# Altium footprint library myPcbLib.PcbLib: 987 footprints (part 42 of 62)
Each footprint in its own frame and in the unit in brackets; x right, y up, seen from the top. Pads: shape width x height; smd on the part's side, far side on the other; paste and mask are expansions set on the pad; w line width, h text height; cw(c..) or ccw(c..) is an arc to the next point about the centre after c.
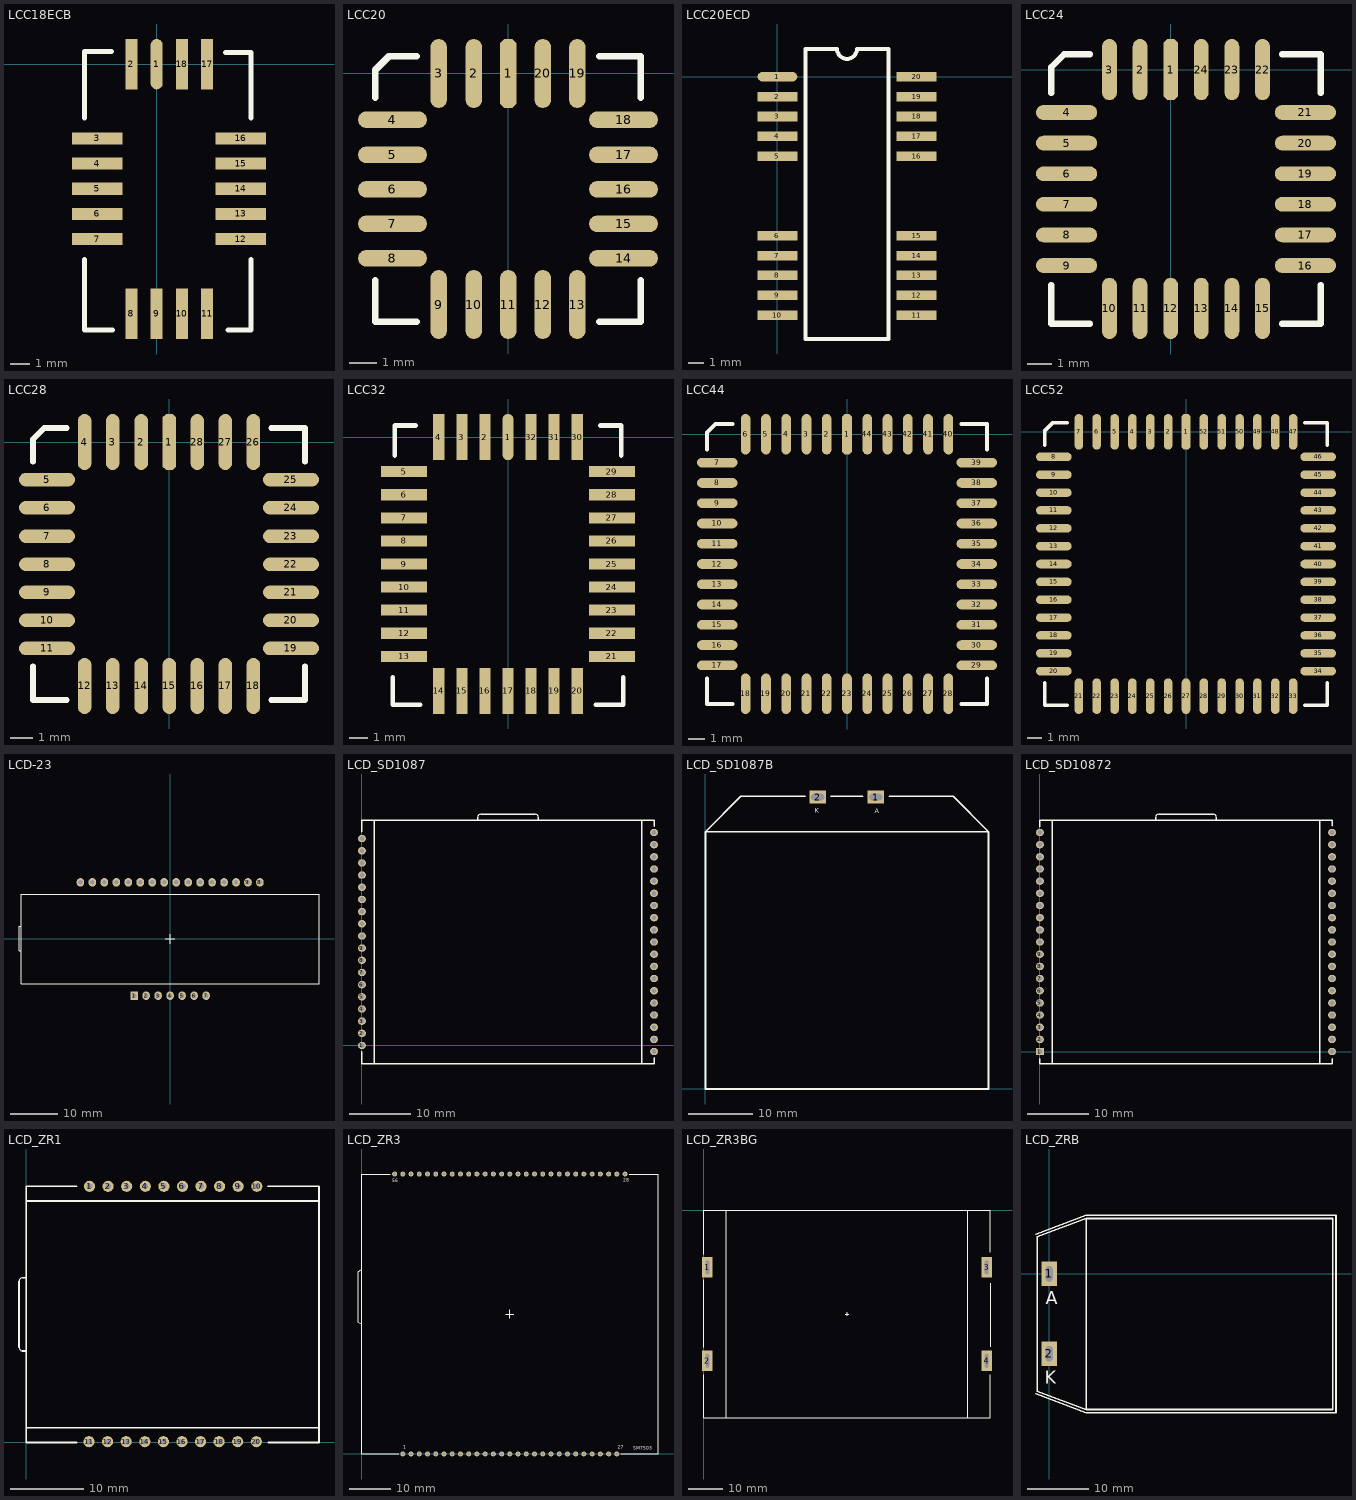
[diagram p41: the footprints below, top view; thin cyan lines are the x and y axes]

## LCC18ECB [mil]
pads (18):
  oval 24x100 smd: 1(0,0)
  rect 24x100 smd: 2(-50,0) 8(-50,-495) 9(0,-495) 10(50,-495) 11(100,-495) 17(100,0) 18(50,0)
  rect 100x24 smd: 3(-118,-147) 4(-118,-197) 5(-118,-247) 6(-118,-297) 7(-118,-347) 12(167,-347) 13(167,-297) 14(167,-247) 15(167,-197) 16(167,-147)
Top Overlay:
  lines w10: -143,-387 -143,-527 -88,-527 ; -143,-107 -143,25 -90,25 ; 137,23 187,23 187,-107 ; 142,-527 187,-527 187,-387

## LCC20 [mil]
pads (20):
  oct 24x100 smd: 1(0,0)
  oval 24x100 smd: 2(-50,0) 3(-101,0) 9(-101,-335) 10(-50,-335) 11(0,-335) 12(50,-335) 13(100,-335) 19(100,0) 20(50,0)
  oval 100x24 smd: 4(-168,-67) 5(-168,-118) 6(-168,-168) 7(-168,-218) 8(-168,-268) 14(167,-268) 15(167,-218) 16(167,-168) 17(167,-118) 18(167,-67)
Top Overlay:
  lines w10: -193,-300 -193,-360 -133,-360 ; -193,-35 -193,5 -173,25 -133,25 ; 132,-360 192,-360 192,-300 ; 132,25 192,25 192,-35

## LCC20ECD [mil]
pads (20):
  oval 100x24 smd: 1(0,0)
  rect 100x24 smd: 2(0,-50) 3(0,-100) 4(0,-150) 5(0,-200) 6(0,-400) 7(0,-450) 8(0,-500) 9(0,-550) 10(0,-600) 11(350,-600) 12(350,-550) 13(350,-500) 14(350,-450) 15(350,-400) 16(350,-200) 17(350,-150) 18(350,-100) 19(350,-50) 20(350,0)
Top Overlay:
  lines w10: 70,-660 280,-660 280,70 200,70 cw(c175,70) 150,70 70,70 70,-660

## LCC24 [mil]
pads (24):
  oct 24x100 smd: 1(0,0)
  oval 24x100 smd: 2(-50,0) 3(-100,0) 10(-100,-390) 11(-50,-390) 12(0,-390) 13(50,-390) 14(100,-390) 15(150,-390) 22(150,0) 23(100,0) 24(50,0)
  oval 100x24 smd: 4(-170,-70) 5(-170,-120) 6(-170,-170) 7(-170,-220) 8(-170,-270) 9(-170,-320) 16(220,-320) 17(220,-270) 18(220,-220) 19(220,-170) 20(220,-120) 21(220,-70)
Top Overlay:
  lines w10: -195,-352 -195,-415 -132,-415 ; -195,-38 -195,4 -174,25 -132,25 ; 182,-415 245,-415 245,-352 ; 182,25 245,25 245,-38

## LCC28 [mil]
pads (28):
  oct 24x100 smd: 1(0,0)
  oval 24x100 smd: 2(-50,0) 3(-101,0) 4(-151,0) 12(-151,-435) 13(-101,-435) 14(-50,-435) 15(0,-435) 16(50,-435) 17(100,-435) 18(150,-435) 26(150,0) 27(100,0) 28(50,0)
  oval 100x24 smd: 5(-218,-67) 6(-218,-117) 7(-218,-168) 8(-218,-218) 9(-218,-268) 10(-218,-318) 11(-218,-368) 19(217,-368) 20(217,-318) 21(217,-268) 22(217,-218) 23(217,-168) 24(217,-117) 25(217,-67)
Top Overlay:
  lines w10: -243,-400 -243,-460 -183,-460 ; -243,-35 -243,5 -223,25 -183,25 ; 182,-460 242,-460 242,-400 ; 182,25 242,25 242,-35

## LCC32 [mil]
pads (32):
  oval 24x100 smd: 1(0,0)
  rect 24x100 smd: 2(-50,0) 3(-100,0) 4(-150,0) 14(-150,-550) 15(-100,-550) 16(-50,-550) 17(0,-550) 18(50,-550) 19(100,-550) 20(150,-550) 30(150,0) 31(100,0) 32(50,0)
  rect 100x24 smd: 5(-225,-75) 6(-225,-125) 7(-225,-175) 8(-225,-225) 9(-225,-275) 10(-225,-325) 11(-225,-375) 12(-225,-425) 13(-225,-475) 21(225,-475) 22(225,-425) 23(225,-375) 24(225,-325) 25(225,-275) 26(225,-225) 27(225,-175) 28(225,-125) 29(225,-75)
Top Overlay:
  lines w10: -250,-520 -250,-580 -190,-580 ; -245,-40 -245,25 -200,25 ; 190,-580 250,-580 250,-520 ; 200,25 245,25 245,-40

## LCC44 [mil]
pads (44):
  oct 24x100 smd: 1(0,0)
  oval 24x100 smd: 2(-50,0) 3(-100,0) 4(-150,0) 5(-200,0) 6(-250,0) 18(-250,-640) 19(-200,-640) 20(-150,-640) 21(-100,-640) 22(-50,-640) 23(0,-640) 24(50,-640) 25(100,-640) 26(150,-640) 27(200,-640) 28(250,-640) 40(250,0) 41(200,0) 42(150,0) 43(100,0) 44(50,0)
  oval 100x24 smd: 7(-320,-70) 8(-320,-120) 9(-320,-170) 10(-320,-220) 11(-320,-270) 12(-320,-320) 13(-320,-370) 14(-320,-420) 15(-320,-470) 16(-320,-520) 17(-320,-570) 29(320,-570) 30(320,-520) 31(320,-470) 32(320,-420) 33(320,-370) 34(320,-320) 35(320,-270) 36(320,-220) 37(320,-170) 38(320,-120) 39(320,-70)
Top Overlay:
  lines w10: -345,-602 -345,-665 -282,-665 ; -345,-38 -345,4 -324,25 -282,25 ; 282,-665 345,-665 345,-602 ; 282,25 345,25 345,-38

## LCC52 [mil]
pads (52):
  oct 24x100 smd: 1(0,0)
  oval 24x100 smd: 2(-50,0) 3(-100,0) 4(-150,0) 5(-200,0) 6(-250,0) 7(-300,0) 21(-300,-740) 22(-250,-740) 23(-200,-740) 24(-150,-740) 25(-100,-740) 26(-50,-740) 27(0,-740) 28(50,-740) 29(100,-740) 30(150,-740) 31(200,-740) 32(250,-740) 33(300,-740) 47(300,0) 48(250,0) 49(200,0) 50(150,0) 51(100,0) 52(50,0)
  oval 100x24 smd: 8(-370,-70) 9(-370,-120) 10(-370,-170) 11(-370,-220) 12(-370,-270) 13(-370,-320) 14(-370,-370) 15(-370,-420) 16(-370,-470) 17(-370,-520) 18(-370,-570) 19(-370,-620) 20(-370,-670) 34(370,-670) 35(370,-620) 36(370,-570) 37(370,-520) 38(370,-470) 39(370,-420) 40(370,-370) 41(370,-320) 42(370,-270) 43(370,-220) 44(370,-170) 45(370,-120) 46(370,-70)
Top Overlay:
  lines w10: -395,-702 -395,-765 -332,-765 ; -395,-38 -395,4 -374,25 -332,25 ; 332,-765 395,-765 395,-702 ; 332,25 395,25 395,-38

## LCD-23 [mm] "GDH784WP"
height 6
pads (23):
  rect 1.6x1.8 hole 0.94: 1(-7.64,-12.003)
  oval 1.6x1.8 hole 0.94: 2(-5.1,-12.003) 3(-2.56,-12.003) 4(-0.02,-12.003) 5(2.52,-12.003) 6(5.06,-12.003) 7(7.6,-12.003) 8(19,12) 9(16.467,12) 10(13.933,12)
  oval 1.6x1.8 hole 0.99: 11(11.4,12) 12(8.867,12) 13(6.333,12) 14(3.8,12) 15(1.267,12) 16(-1.267,12) 17(-3.8,12) 18(-6.333,12) 19(-8.867,12) 20(-11.4,12) 21(-13.933,12) 22(-16.467,12) 23(-19,12)
Top Overlay:
  lines w0.254: -1,0 1,0 0,0 ; 0,-1 0,1 ; -32,-2.5 -31.5,-2.5 -31.5,2.75 -32,2.75 -32,-2.5 ; -31.5,-9.5 31.5,-9.5 31.5,9.5 -31.5,9.5 -31.5,-9.5

## LCD_SD1087 [mm]
height 2.7
pads (37):
  oval 1.3x1.2 hole 0.8: 1(0,0) 2(0,2) 3(0,4) 4(0,6) 5(0,8) 6(0,10) 7(0,12) 8(0,14) 9(0,16) 10(0,18) 11(0,20) 12(0,22) 13(0,24) 14(0,26) 15(0,28) 16(0,30) 17(0,32) 18(0,34) 19(48,-1) 20(48,1) 21(48,3) 22(48,5) 23(48,7) 24(48,9) 25(48,11) 26(48,13) 27(48,15) 28(48,17) 29(48,19) 30(48,21) 31(48,23) 32(48,25) 33(48,27) 34(48,29) 35(48,31) 36(48,33) 37(48,35)
Top Overlay:
  lines w0.127: 19,37.499 cw(c19.5,37.499) 19.5,37.999 ; 28.5,37.999 cw(c28.5,37.499) 29,37.499
  lines w0.254: 0,-1.05 0,-3.001 48,-3.001 48,-2.025 ; 0,35.15 0,36.999 48,36.999 48,36.05 ; 2,-3.001 2,36.999 ; 19,36.999 19,37.499 ; 19.5,37.999 28.5,37.999 ; 29,36.999 29,37.499 ; 46,-3.001 46,36.999

## LCD_SD1087B [mm]
pads (2):
  rect 2.5x2 hole 1 slot 2 at 0 deg: 1(26.474,45.373) 2(17.457,45.373)
Top Overlay:
  lines w0.254: 0,1.2 0,0 ; 15.527,45.5 5.5,45.5 0,40 ; 19.489,45.491 24.417,45.491 ; 28.608,45.5 38.5,45.5 44,40 ; 44,1.2 44,0 ; 0,0 0,40 ; 0,0 44,0 ; 0,40 44,40 ; 44,0 44,40
  text "K" at 17,42.951 h0.75
  text "A" at 26.347,42.824 h0.75

## LCD_SD10872 [mm]
height 2.7
pads (38):
  rect 1.3x1.2 hole 0.8: 1(0,0)
  oval 1.3x1.2 hole 0.8: 2(0,2) 3(0,4) 4(0,6) 5(0,8) 6(0,10) 7(0,12) 8(0,14) 9(0,16) 10(0,18) 11(0,20) 12(0,22) 13(0,24) 14(0,26) 15(0,28) 16(0,30) 17(0,32) 18(0,34) 19(0,36) 20(48,0) 21(48,2) 22(48,4) 23(48,6) 24(48,8) 25(48,10) 26(48,12) 27(48,14) 28(48,16) 29(48,18) 30(48,20) 31(48,22) 32(48,24) 33(48,26) 34(48,28) 35(48,30) 36(48,32) 37(48,34) 38(48,36)
Top Overlay:
  lines w0.127: 19,38.498 cw(c19.5,38.498) 19.5,38.998 ; 28.5,38.998 cw(c28.5,38.498) 29,38.498
  lines w0.254: 0,-1.2 0,-2.002 48,-2.002 48,-1.15 ; 2,-2.002 2,37.998 ; 19,37.998 19,38.498 ; 19.5,38.998 28.5,38.998 ; 29,37.998 29,38.498 ; 46,-2.002 46,37.998 ; 48,37.075 48,37.998 0,37.998 ; 0,37.998 0,36.925 0,37.998

## LCD_ZR1 [mil]
pads (20):
  round 60 hole 30: 1(340.08,1377.95) 2(440.16,1377.95) 3(540.16,1377.95) 4(640.16,1377.95) 5(740.16,1377.95) 6(840.16,1377.95) 7(940.16,1377.95) 8(1040.16,1377.95) 9(1140.16,1377.95) 10(1240.16,1377.95) 11(337.4,3.94) 12(437.4,3.94) 13(537.4,3.94) 14(637.4,3.94) 15(737.4,3.94) 16(837.4,3.94) 17(937.4,3.94) 18(1037.4,3.94) 19(1137.4,3.94) 20(1237.4,3.94)
Top Overlay:
  lines w5: -39.37,511.81 ccw(c-19.69,511.81) -19.69,492.13 cw(c-19.69,511.81) -39.37,511.81 ; -39.37,866.14 cw(c-19.69,866.14) -19.69,885.83 ccw(c-19.69,866.14) -39.37,866.14
  lines w10: 271.65,0 0,0 ; 271.65,1377.95 0,1377.95 ; 1299.21,1377.95 1574.8,1377.95 ; 1303.15,0 1574.8,0 ; 0,0 0,1377.95 ; 0,0 0,1377.95 ; 1574.8,0 1574.8,1377.95 ; 1574.8,0 1574.8,1377.95 ; -39.37,511.81 -39.37,866.14 -39.37,511.81 ; -19.69,492.13 0,492.13 -19.69,492.13 ; -19.69,885.83 0,885.83 -19.69,885.83 ; 0,78.74 1574.8,78.74 0,78.74 ; 0,1299.21 1574.8,1299.21 0,1299.21

## LCD_ZR3 [mm]
pads (56):
  round 1.2 hole 0.7: 1(10,0) 2(12,0) 3(14,0) 4(16,0) 5(18,0) 6(20,0) 7(22,0) 8(24,0) 9(26,0) 10(28,0) 11(30,0) 12(32,0) 13(34,0) 14(36,0) 15(38,0) 16(40,0) 17(42,0) 18(44,0) 19(46,0) 20(48,0) 21(50,0) 22(52,0) 23(54,0) 24(56,0) 25(58,0) 26(60,0) 27(62,0) 28(64,68) 29(62,68) 30(60,68) 31(58,68) 32(56,68) 33(54,68) 34(52,68) 35(50,68) 36(48,68) 37(46,68) 38(44,68) 39(42,68) 40(40,68) 41(38,68) 42(36,68) 43(34,68) 44(32,68) 45(30,68) 46(28,68) 47(26,68) 48(24,68) 49(22,68) 50(20,68) 51(18,68) 52(16,68) 53(14,68) 54(12,68) 55(10,68) 56(8,68)
Top Overlay:
  lines w0.254: 0,31.623 -0.889,32.004 -0.889,44.323 0,44.831 ; 7,68 0,68 0,0 9,0 ; 35,34 37,34 ; 36,33 36,35 ; 63,0 72,0 72,68 65,68
  text "1" at 10.16,1.27 h0.76
  text "27" at 62.23,1.27 h0.76
  text "28" at 63.525,66.142 h0.76
  text "56" at 7.417,66.015 h0.76
  text "SM7503" at 66,1 h0.76

## LCD_ZR3BG [mm]
pads (4):
  rect 3x6 hole 1 slot 4 at 90 deg: 1(1.1,-16.5) 2(1.1,-43.5) 3(81.9,-16.5) 4(81.9,-43.5)
Top Overlay:
  lines w0.254: 0,-47.549 0,-60 83,-60 83,-47.607 ; 0,-39.675 0,-20.117 ; 0,-12.751 0,0 83,0 83,-12.185 ; 6.5,-60 6.5,0 ; 41,-30 42,-30 ; 41.5,-30.5 41.5,-29.5 ; 76.5,-60 76.5,0 ; 83.058,-39.421 83.058,-21.133

## LCD_ZRB [mm]
pads (2):
  rect 2.5x4 hole 1.2 slot 2.5 at 90 deg: 1(0,0) 2(0,-12.954)
Top Overlay:
  lines w0.254: -2.149,-19.479 5.936,-22.511 46.527,-22.511 46.527,9.489 5.936,9.489 -2.149,6.457 ; 6.027,-22.011 6.027,8.989 ; 6.027,-22.011 46.027,-22.011 46.027,8.989 6.027,8.989 ; 6.027,-22.011 -1.973,-19.011 -1.973,5.989 6.027,8.989
  text "K" at -0.7,-17.8 h2.08
  text "A" at -0.6,-4.9 h2.08